# Altium footprint library bethu.PcbLib: 628 footprints (part 9 of 40)
Each footprint in its own frame and in the unit in brackets; x right, y up, seen from the top. Pads: shape width x height; smd on the part's side, far side on the other; paste and mask are expansions set on the pad; w line width, h text height; cw(c..) or ccw(c..) is an arc to the next point about the centre after c.
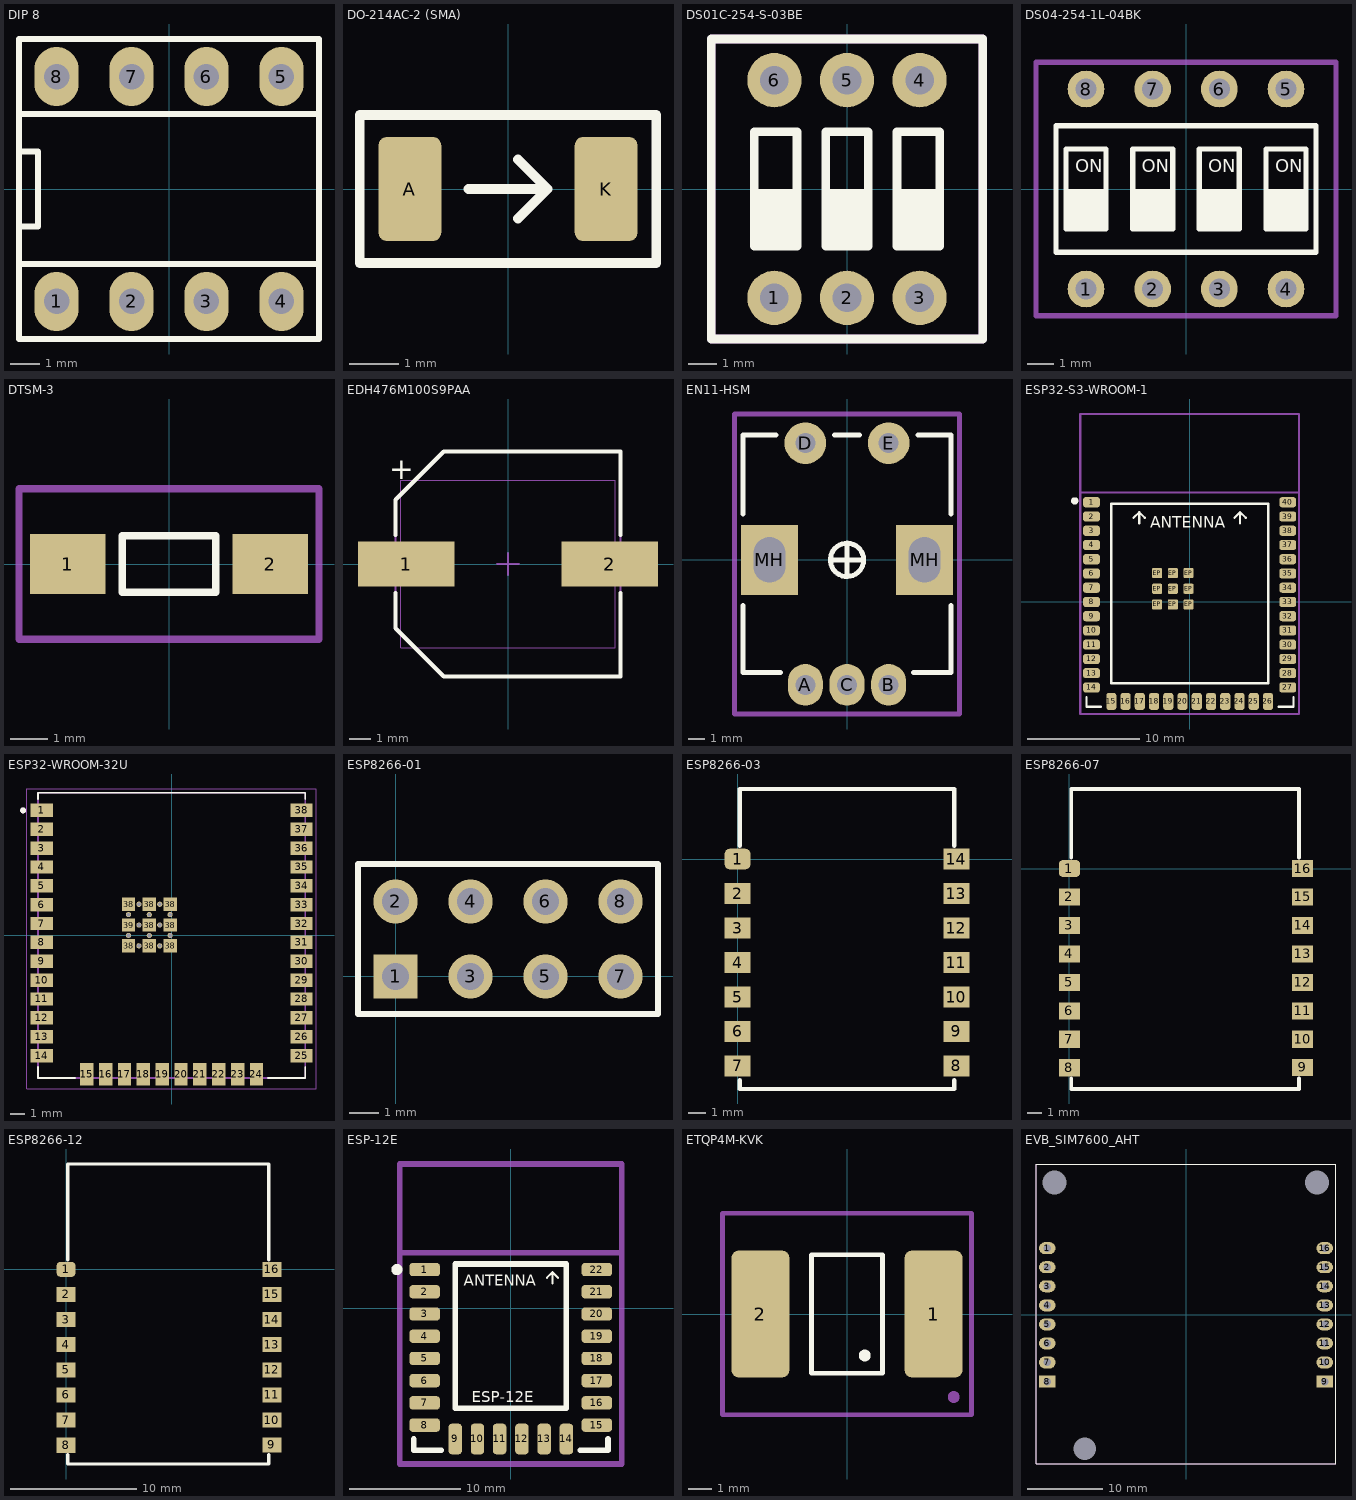
[diagram p8: the footprints below, top view; thin cyan lines are the x and y axes]

## DIP 8 [mm] "W.300/L.400"
pads (8):
  oval 1.5x2 hole 0.864: 1(-3.81,-3.81) 2(-1.27,-3.81) 3(1.27,-3.81) 4(3.81,-3.81) 5(3.81,3.81) 6(1.27,3.81) 7(-1.27,3.81) 8(-3.81,3.81)
Top Overlay:
  lines w0.203: -5.08,-2.54 -5.08,-1.27 ; -5.08,-2.54 -5.08,-5.08 5.08,-5.08 5.08,2.54 ; -5.08,-2.54 -5.08,2.54 ; -5.08,-2.54 5.08,-2.54 ; -5.08,-2.54 -5.08,2.54 ; -5.08,-2.54 5.08,-2.54 ; -5.08,-1.27 -5.08,1.27 ; -5.08,-1.27 -4.445,-1.27 ; -5.08,-1.27 -4.445,-1.27 ; -5.08,1.27 -5.08,5.08 5.08,5.08 5.08,2.54 ; -5.08,1.27 -4.445,1.27 ; -5.08,1.27 -4.445,1.27 ; -5.08,2.54 5.08,2.54 ; -5.08,2.54 5.08,2.54 ; -4.445,-1.27 -4.445,1.27 ; -4.445,-1.27 -4.445,1.27 ; 5.08,-2.54 5.08,2.54 ; 5.08,-2.54 5.08,2.54
3D body "User Library-DIP8-300-metric.step": height 4.5, standoff -3.5, extent -5.4,-3.88 5.4,3.88

## DO-214AC-2 (SMA) [mm]
pads (2):
  rrect25% 1.27x2.1 smd: A(-1.985,0) K(1.985,0)
Top Overlay:
  lines w0.2: -0.8,0 0.8,0 ; 0.2,-0.6 0.8,0 ; 0.2,0.6 0.8,0 ; 0.8,0 0.8,0 ; -3,-1.5 -3,1.5 3,1.5 3,-1.5 -3,-1.5
Mechanical 13:
  text "'.Designator'" at -5.84,-0.925 h1
3D body "DO-214AC_SMA.step": height 2.42, standoff 0.01, extent -2.6,-1.3 2.6,1.3

## DS01C-254-S-03BE [mm]
pads (6):
  round 1.9 hole 1: 1(-2.54,-3.81) 2(0,-3.81) 3(2.54,-3.81) 4(2.54,3.81) 5(0,3.81) 6(-2.54,3.81)
Top Overlay:
  rectangle: -3.25,-2 -1.75,0
  rectangle: -0.75,-2 0.75,0
  rectangle: 1.75,-2 3.25,0
  lines w0.3: -4.75,-5.25 4.75,-5.25 4.75,5.25 -4.75,5.25 -4.75,-5.25 ; -3.25,-2 -3.25,2 -1.75,2 -1.75,-2 -3.25,-2 ; -0.75,-2 -0.75,2 0.75,2 0.75,-2 -0.75,-2 ; 1.75,-2 1.75,2 3.25,2 3.25,-2 1.75,-2
Mechanical 13:
  lines w0.3: -4.75,-5.25 4.75,-5.25 4.75,5.25 -4.75,5.25 -4.75,-5.25
  text "'.Designator'" at -5.665,-0.417 h1
  text "ON" at -4.083,3.5 h1
3D body "DS01-254-S-03BE.step": height 6.56, standoff -2.99, extent -4.525,-4.95 4.515,4.95

## DS04-254-1L-04BK [mm]
pads (8):
  round 1.4 hole 0.8: 1(-3.81,-3.81) 2(-1.27,-3.81) 3(1.27,-3.81) 4(3.81,-3.81) 5(3.81,3.81) 6(1.27,3.81) 7(-1.27,3.81) 8(-3.81,3.81)
Top Overlay:
  rectangle: 3.048,-1.524 4.572,0
  rectangle: 0.508,-1.524 2.032,0
  rectangle: -2.032,-1.524 -0.508,0
  rectangle: -4.572,-1.524 -3.048,0
  lines w0.2: -4.953,-2.413 4.953,-2.413 4.953,2.413 -4.953,2.413 -4.953,-2.413 ; -4.572,-1.524 -4.572,1.524 -3.048,1.524 -3.048,-1.524 -4.572,-1.524 ; -2.032,-1.524 -2.032,1.524 -0.508,1.524 -0.508,-1.524 -2.032,-1.524 ; 0.508,-1.524 0.508,1.524 2.032,1.524 2.032,-1.524 0.508,-1.524 ; 3.048,-1.524 3.048,1.524 4.572,1.524 4.572,-1.524 3.048,-1.524
  text "ON" at 3.393,0.639 h0.5
  text "ON" at 0.853,0.639 h0.5
  text "ON" at -1.687,0.639 h0.5
  text "ON" at -4.227,0.639 h0.5
Mechanical 13:
  lines w0.2: -5.715,-4.826 5.715,-4.826 5.715,4.826 -5.715,4.826 -5.715,-4.826
  text "ON" at -4.643,1.532 h1
  text ".Designator" at -4.998,-0.333 h1
3D body "DS04-254-1L-04BK.step": height 4.04, standoff -4.45, extent -5.577,-3.912 5.583,3.958

## DTSM-3 [mm]
pads (2):
  rect 2x1.6 smd: 1(-2.7,0) 2(2.7,0)
Top Overlay:
  lines w0.2: -1.25,-0.75 -1.25,0.75 1.25,0.75 1.25,-0.75 -1.25,-0.75
Mechanical 13:
  lines w0.2: -4,-2 -4,2 4,2 4,-2 -4,-2
  text ".Designator" at -4.998,-0.333 h1
3D body "DTSM-32.STEP": height 4.96, standoff -0.04, extent -3.6,-1.75 3.6,1.75

## EDH476M100S9PAA [mm]
height 10.5
pads (2):
  rect 4.5x2.1 smd: 1(-4.75,0) 2(4.75,0)
Top Overlay:
  lines w0.2: -5.25,-1.35 -5.25,-3 -3,-5.25 5.25,-5.25 5.25,-1.35 ; -5.25,1.35 -5.25,3 -3,5.25 5.25,5.25 5.25,1.35
  text "+" at -5.55,3.95 h1
Mechanical 13:
  lines w0.1: -5.25,-3 -3,-5.25 5.25,-5.25 5.25,5.25 -3,5.25 -5.25,3 -5.25,-3
  text "'.Designator'" at -5.815,-0.9 h1
  text "+" at -10.565,3.85 h1
Mechanical 15:
  lines w0.05: -5,-3.9 -5,3.9 5,3.9 5,-3.9 -5,-3.9
  lines w0.1: -0.5,0 0.5,0 ; 0,-0.5 0,0.5
3D body "EDH476M100S9PAA.stp": height 10.52, standoff 0.01, extent -6.1,-5.25 6.1,5.25

## EN11-HSM [mm]
pads (7):
  oval 2.1x2.5 hole 1.2: A(-2.5,-7.5) B(2.5,-7.5) C(0,-7.5)
  round 2.5 hole 1.2: D(-2.5,7) E(2.5,7)
  rect 3.4x4.2 hole 1.9 slot 2.7 at 90 deg: MH(-4.65,0) MH(4.65,0)
Top Overlay:
  circle w0.3: c0,0 r1
  lines w0.3: -6.25,-2.75 -6.25,-6.75 -4,-6.75 ; -6.25,2.75 -6.25,7.5 -4.25,7.5 ; -1,0 1,0 ; -0.75,7.5 0.75,7.5 ; 0,-1 0,1 ; 4,-6.75 6.25,-6.75 6.25,-2.75 ; 4.25,7.5 6.25,7.5 6.25,2.75
Mechanical 13:
  lines w0.3: -6.75,-9.25 6.75,-9.25 6.75,8.75 -6.75,8.75 -6.75,-9.25
  text "'.Designator'" at -5.665,-0.417 h1
3D body "EN11-HSM1AF15.STEP": height 21.65, standoff -3.45, extent -5.85,-7.625 5.85,7.25

## ESP32-S3-WROOM-1 [mm]
pads (49):
  rrect50% 1.5x0.9 smd: 1(-8.75,8.88) 2(-8.75,7.61) 3(-8.75,6.34) 4(-8.75,5.07) 5(-8.75,3.8) 6(-8.75,2.53) 7(-8.75,1.26) 8(-8.75,-0.01) 9(-8.75,-1.28) 10(-8.75,-2.55) 11(-8.75,-3.82) 12(-8.75,-5.09) 13(-8.75,-6.36) 14(-8.75,-7.63) 27(8.75,-7.63) 28(8.75,-6.36) 29(8.75,-5.09) 30(8.75,-3.82) 31(8.75,-2.55) 32(8.75,-1.28) 33(8.75,-0.01) 34(8.75,1.26) 35(8.75,2.53) 36(8.75,3.8) 37(8.75,5.07) 38(8.75,6.34) 39(8.75,7.61) 40(8.75,8.88)
  rrect50% 0.9x1.5 smd: 15(-6.985,-8.88) 16(-5.715,-8.88) 17(-4.445,-8.88) 18(-3.175,-8.88) 19(-1.905,-8.88) 20(-0.635,-8.88) 21(0.635,-8.88) 22(1.905,-8.88) 23(3.175,-8.88) 24(4.445,-8.88) 25(5.715,-8.88) 26(6.985,-8.88)
  rrect25% 0.9x0.9 smd: EP(-2.9,-0.235) EP(-2.9,1.165) EP(-2.9,2.565) EP(-1.5,-0.235) EP(-1.5,1.165) EP(-1.5,2.565) EP(-0.1,-0.235) EP(-0.1,1.165) EP(-0.1,2.565)
Top Overlay:
  circle w0.35: c-10.25,9 r0.15
  lines w0.2: -9.2,-8.5 -9.2,-9.364 -7.9,-9.364 ; -5,7.5 -4.5,8 ; -4.5,7 -4.5,8 ; -4,7.5 -4.5,8 ; 4,7.5 4.5,8 ; 4.5,7 4.5,8 ; 5,7.5 4.5,8 ; 7.95,-9.364 9.25,-9.364 9.25,-8.5 ; -7,-7.25 7,-7.25 7,8.75 -7,8.75 -7,-7.25
  text "ANTENNA" at -3.532,6.6 h1
Mechanical 13:
  circle w0.35: c-8.796,8.893 r0.15
  lines w0.2: -9.75,9.75 9.75,9.75 ; -9.75,-10 -9.5,-10 9.75,-10 9.75,16.75 -9.75,16.75 -9.75,-10
  text "ANTENNA / KEEP-OUT" at -7.964,10.391 h2
  text "'.Designator'" at -5.815,-0.9 h1
3D body "ESP32-S3-WROOM.step": height 3.18, standoff 0.02, extent -9.01,-9.14 9.01,16.37

## ESP32-WROOM-32U [mm]
height 3.25
pads (59):
  rect 1.5x0.9 smd: 1(-8.75,8.41) 2(-8.75,7.14) 3(-8.75,5.87) 4(-8.75,4.6) 5(-8.75,3.33) 6(-8.75,2.06) 7(-8.75,0.79) 8(-8.75,-0.48) 9(-8.75,-1.75) 10(-8.75,-3.02) 11(-8.75,-4.29) 12(-8.75,-5.56) 13(-8.75,-6.83) 14(-8.75,-8.1) 25(8.75,-8.1) 26(8.75,-6.83) 27(8.75,-5.56) 28(8.75,-4.29) 29(8.75,-3.02) 30(8.75,-1.75) 31(8.75,-0.48) 32(8.75,0.79) 33(8.75,2.06) 34(8.75,3.33) 35(8.75,4.6) 36(8.75,5.87) 37(8.75,7.14) 38(8.75,8.41)
  rect 0.9x1.5 smd: 15(-5.715,-9.35) 16(-4.445,-9.35) 17(-3.175,-9.35) 18(-1.905,-9.35) 19(-0.635,-9.35) 20(0.635,-9.35) 21(1.905,-9.35) 22(3.175,-9.35) 23(4.445,-9.35) 24(5.715,-9.35)
  rect 0.9x0.9 smd: 38(-2.9,-0.71) 38(-2.9,2.09) 38(-1.5,-0.71) 38(-1.5,0.69) 38(-1.5,2.09) 38(-0.1,-0.71) 38(-0.1,0.69) 38(-0.1,2.09) 39(-2.9,0.69)
  round 0.35 hole 0.25 mask+0: 40_1(-2.2,2.09) 40_2(-0.8,2.09) 40_3(-2.9,1.39) 40_4(-1.5,1.39) 40_5(-0.1,1.39) 40_6(-2.2,0.69) 40_7(-0.8,0.69) 40_8(-2.9,-0.01) 40_9(-1.5,-0.01) 40_10(-0.1,-0.01) 40_11(-2.2,-0.71) 40_12(-0.8,-0.71)
Top Overlay:
  circle w0.2: c-10,8.41 r0.1
  lines w0.127: -9,-8.87 -9,-9.6 -6.485,-9.6 ; -9,9.18 -9,9.6 9,9.6 9,9.18 ; 6.485,-9.6 9,-9.6 9,-8.87
Mechanical 13:
  circle w0.2: c-10,8.41 r0.1
  lines w0.127: -9,-9.6 -9,9.6 9,9.6 9,-9.6 -9,-9.6
Mechanical 15:
  lines w0.05: -9.75,-10.35 -9.75,9.85 9.75,9.85 9.75,-10.35 -9.75,-10.35
3D body "step_temp.STEP": height 3.35, standoff 0, extent -9,-9.6 9,9.6

## ESP8266-01 [mm]
pads (8):
  rect 1.5x1.5 hole 0.9: 1(0,0)
  round 1.5 hole 0.9: 2(0,2.54) 3(2.54,0) 4(2.54,2.54) 5(5.08,0) 6(5.08,2.54) 7(7.62,0) 8(7.62,2.54)
Top Overlay:
  lines w0.2: -1.27,-1.27 8.89,-1.27 8.89,3.81 -1.27,3.81 -1.27,-1.27
3D body "User Library-RM254_4pin.STEP": height 6.02, standoff -3.1, extent -1.27,1.27 8.89,3.81
3D body "User Library-RM254_4pin.STEP": height 6.02, standoff -3.1, extent -1.27,-1.27 8.89,1.27
3D body "User Library-Wi07C.STEP": height 11.88, standoff 0.2, extent -3.44,-1.397 11.06,23.403

## ESP8266-03 [mm]
pads (14):
  rrect50% 1.5x1.2 smd: 1(0,0)
  rect 1.5x1.2 smd: 2(0,-2) 3(0,-4) 4(0,-6) 5(0,-8) 6(0,-10) 7(0,-12) 8(12.7,-12) 9(12.7,-10) 10(12.7,-8) 11(12.7,-6) 12(12.7,-4) 13(12.7,-2) 14(12.7,0)
Top Overlay:
  lines w0.254: 0.127,-12.827 0.127,-13.335 12.573,-13.335 12.573,-12.827 ; 0.127,0.762 0.127,4.064 12.573,4.064 12.573,0.762
3D body "User Library-ESP-03.STEP": height 3.42, standoff -0.02, extent 0.254,-13.222 12.554,4.078

## ESP8266-07 [mm]
pads (16):
  rrect50% 1.5x1.2 smd: 1(0,0)
  rect 1.5x1.2 smd: 2(0,-2) 3(0,-4) 4(0,-6) 5(0,-8) 6(0,-10) 7(0,-12) 8(0,-14) 9(16.383,-13.97) 10(16.383,-12) 11(16.383,-10) 12(16.383,-8) 13(16.383,-6) 14(16.383,-4) 15(16.383,-2) 16(16.383,0)
Top Overlay:
  lines w0.254: 0.127,-14.732 0.127,-15.494 16.129,-15.494 16.129,-14.732 ; 0.127,0.762 0.127,5.588 16.129,5.588 16.129,0.762
3D body "User Library-WiFi ESP8266.STEP": height 3.6, standoff -0.05, extent 0.127,-15.553 16.127,5.647

## ESP8266-12 [mm]
pads (16):
  rrect50% 1.5x1.2 smd: 1(0,0)
  rect 1.5x1.2 smd: 2(0,-2) 3(0,-4) 4(0,-6) 5(0,-8) 6(0,-10) 7(0,-12) 8(0,-14) 9(16.383,-13.97) 10(16.383,-12) 11(16.383,-10) 12(16.383,-8) 13(16.383,-6) 14(16.383,-4) 15(16.383,-2) 16(16.383,0)
Top Overlay:
  lines w0.254: 0.127,-14.732 0.127,-15.494 16.129,-15.494 16.129,-14.732 ; 0.127,0.762 0.127,8.382 16.129,8.382 16.129,0.762
3D body "User Library-ESP_12_E.STEP": height 2.24, standoff 0.04, extent 0.127,-15.556 16.127,8.444

## ESP-12E [mm]
pads (22):
  rrect50% 2.75x1.2 smd: 1(-7.75,3.5) 2(-7.75,1.5) 3(-7.75,-0.5) 4(-7.75,-2.5) 5(-7.75,-4.5) 6(-7.75,-6.5) 7(-7.75,-8.5) 8(-7.75,-10.5) 15(7.75,-10.5) 16(7.75,-8.5) 17(7.75,-6.5) 18(7.75,-4.5) 19(7.75,-2.5) 20(7.75,-0.5) 21(7.75,1.5) 22(7.75,3.5)
  rrect50% 1.2x2.75 smd: 9(-5,-11.75) 10(-3,-11.75) 11(-1,-11.75) 12(1,-11.75) 13(3,-11.75) 14(5,-11.75)
Top Overlay:
  circle w0.5: c-10.25,3.5 r0.25
  lines w0.2: 3.25,2.75 3.75,3.25 ; 3.75,2.25 3.75,3.25 ; 4.25,2.75 3.75,3.25
  lines w0.5: -8.75,-11.75 -8.75,-12.75 -6.25,-12.75 ; 6.25,-12.75 8.75,-12.75 8.75,-11.75 ; -5,-9 5,-9 5,4 -5,4 -5,-9
  text "ANTENNA" at -4.25,2.05 h1
  text "ESP-12E" at -3.532,-8.45 h1
Mechanical 13:
  circle w0.5: c-7.75,3.5 r0.25
  lines w0.5: -10,5 10,5 ; -10,-14 -10,13 10,13 10,-14 0,-14 -10,-14
  text "'.Designator'" at -5.815,-0.9 h1
  text "ANTENNA / KEEP-OUT" at -5.948,6.911 h1.5
3D body "ESP-12E.step": height 2.66, standoff -0.02, extent -8.005,-12.005 8.005,12

## ETQP4M-KVK [mm]
pads (2):
  rrect25% 2.45x5.35 smd: 1(3.65,0) 2(-3.65,0)
Top Overlay:
  circle w0.3: c0.75,-1.75 r0.101
  lines w0.2: -1.5,-2.5 1.5,-2.5 1.5,2.5 -1.5,2.5 -1.5,-2.5
Mechanical 13:
  circle w0.3: c4.5,-3.5 r0.101
  lines w0.2: -5.25,-4.25 5.25,-4.25 5.25,4.25 -5.25,4.25 -5.25,-4.25
  text "'.Designator'" at -5.665,-0.417 h1
3D body "ETQ-P4M2R2KVK.stp": height 4.01, standoff 0.01, extent -4.25,-4 4.25,4

## EVB_SIM7600_AHT [mm] "View on Top"
pads (19):
  round 0 hole 3.2 unplated: 0(-17.524,17.621) 0(17.476,17.621)
  round 0 hole 3 unplated: 0(-13.524,-17.879)
  oval 2.2x1.6 hole 1: 1(-18.5,8.89) 2(-18.5,6.35) 3(-18.5,3.81) 4(-18.5,1.27) 5(-18.5,-1.27) 6(-18.5,-3.81) 7(-18.5,-6.35) 10(18.5,-6.35) 11(18.5,-3.81) 12(18.5,-1.27) 13(18.5,1.27) 14(18.5,3.81) 15(18.5,6.35) 16(18.5,8.89)
  rect 2.2x1.6 hole 1: 8(-18.5,-8.89) 9(18.5,-8.89)
Top Overlay:
  lines w0.1: -19.99,-19.888 -19.99,20.117 19.99,20.117 19.99,-19.888 -19.99,-19.888
Mechanical 4:
  lines w0.1: -19.99,-19.888 -19.99,20.117 19.99,20.117 19.99,-19.888 -19.99,-19.888
3D body "EVB_SIM7600_V100.step": height 3.17, standoff -9.2, extent -19.99,-20.35 20.079,20.117